# Altium footprint library 7-Connectors-13.PcbLib: 44 footprints (part 1 of 5)
Each footprint in its own frame and in the unit in brackets; x right, y up, seen from the top. Pads: shape width x height; smd on the part's side, far side on the other; paste and mask are expansions set on the pad; w line width, h text height; cw(c..) or ccw(c..) is an arc to the next point about the centre after c.
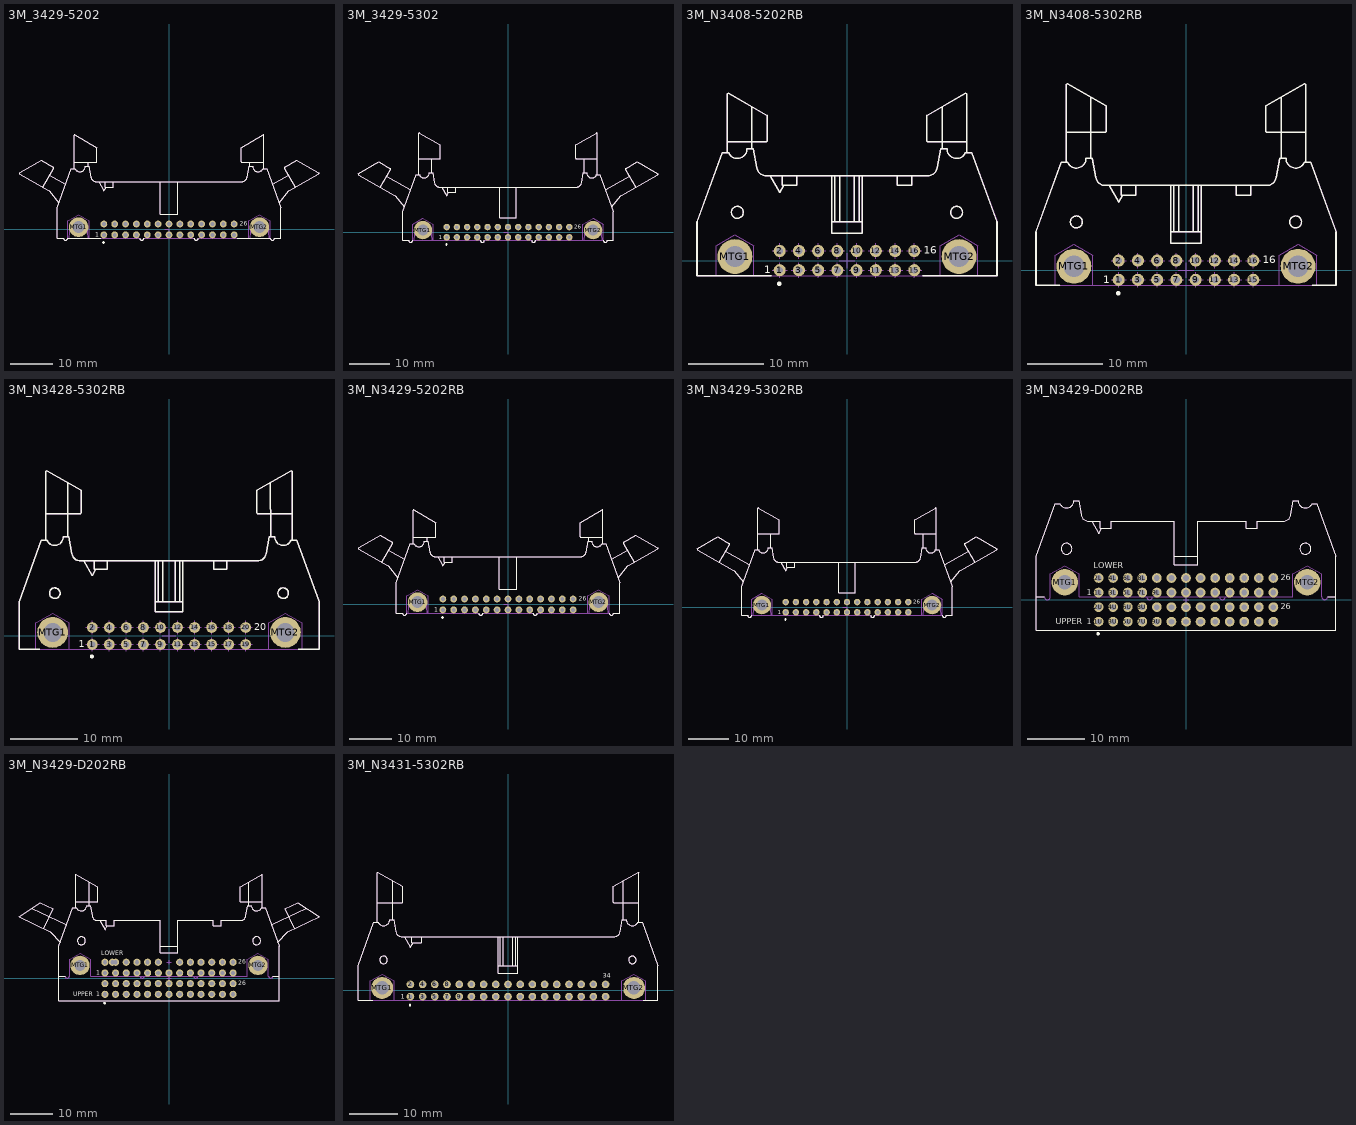
[diagram p0: the footprints below, top view; thin cyan lines are the x and y axes]

## 3M_3429-5202 [mm] "3M, 3000 Series, 26 Contacts - Pitch 2.54mm - Right Angle Four-Wall Header (Grey) With Short Roll Pin Latch/Ejectors"
height 8.6
pads (28):
  round 1.6 hole 0.9: 1(-15.24,-1.27) 2(-15.24,1.27) 3(-12.7,-1.27) 4(-12.7,1.27) 5(-10.16,-1.27) 6(-10.16,1.27) 7(-7.62,-1.27) 8(-7.62,1.27) 9(-5.08,-1.27) 10(-5.08,1.27) 11(-2.54,-1.27) 12(-2.54,1.27) 13(0,-1.27) 14(0,1.27) 15(2.54,-1.27) 16(2.54,1.27) 17(5.08,-1.27) 18(5.08,1.27) 19(7.62,-1.27) 20(7.62,1.27) 21(10.16,-1.27) 22(10.16,1.27) 23(12.7,-1.27) 24(12.7,1.27) 25(15.24,-1.27) 26(15.24,1.27)
  round 4.6 hole 2.8: MTG1(-21.146,0.533) MTG2(21.146,0.533)
Top Overlay:
  circle w0.3: c-15.313,-3.048 r0.15
  lines w0.2: -29.561,9.892 -26.983,14.358 ccw(c-27.071,14.409) -27.02,14.497 -29.935,16.179 -35.04,13.232 ccw(c-34.989,13.144) -35.04,13.056 -28.051,9.02 -25.74,6.266 ; -27.948,12.686 -24.192,10.517 ; -24.702,-2.009 -26.162,-2.007 -26.162,5.105 -22.834,14.249 -21.992,14.249 ccw(c-20.828,14.757) -19.558,14.756 -18.716,14.757 -18.274,12.251 ccw(c-17.023,12.471) -17.023,11.201 17.023,11.201 ccw(c17.023,12.471) 18.274,12.251 18.716,14.757 19.558,14.757 ccw(c20.828,14.757) 21.992,14.249 22.834,14.249 26.162,5.105 26.162,-2.007 24.702,-2.007 cw(c24.194,-2.007) 23.686,-2.007 16,-2.007 ; -24.702,-2.007 ccw(c-24.194,-2.007) -23.686,-2.007 -16,-2.007 ; -22.149,14.249 -22.149,22.024 cw(c-22.047,22.024) -21.996,22.112 -16.891,19.164 -16.891,15.799 cw(c-16.993,15.799) -16.993,15.697 -22.149,15.697 ; -18.923,14.757 -18.923,15.697 ; -16.478,11.201 -15.208,9.002 -14.671,9.931 ; -14.929,11.201 -14.929,9.931 -13.011,9.931 -13.011,11.201 ; -6.858,-2.007 ccw(c-6.35,-2.007) -5.842,-2.007 ; -2.032,11.201 -2.032,3.581 2.032,3.581 2.032,11.201 ; 5.842,-2.007 ccw(c6.35,-2.007) 6.858,-2.007 ; 18.923,14.757 18.923,15.697 ; 22.149,14.249 22.149,22.024 ccw(c22.047,22.024) 21.996,22.112 16.891,19.164 16.891,15.799 ccw(c16.993,15.799) 16.993,15.697 22.149,15.697 ; 24.192,10.517 27.948,12.686 ; 25.74,6.266 28.051,9.02 35.04,13.056 ccw(c34.989,13.144) 35.04,13.232 29.935,16.179 27.02,14.497 ccw(c27.071,14.409) 26.983,14.358 29.561,9.892
  text "26" at 16.5,0.889 h1.02
  text "1" at -17.272,-1.7 h1.02
Mechanical 8:
  circle w0.05: c15.24,1.27 r0.5
  circle w0.05: c12.7,1.27 r0.5
  circle w0.05: c10.16,1.27 r0.5
  circle w0.05: c7.62,1.27 r0.5
  circle w0.05: c5.08,1.27 r0.5
  circle w0.05: c2.54,1.27 r0.5
  circle w0.05: c0,1.27 r0.5
  circle w0.05: c-2.54,1.27 r0.5
  circle w0.05: c-5.08,1.27 r0.5
  circle w0.05: c-7.62,1.27 r0.5
  circle w0.05: c-10.16,1.27 r0.5
  circle w0.05: c-12.7,1.27 r0.5
  circle w0.05: c-15.24,1.27 r0.5
  circle w0.05: c-15.24,-1.27 r0.5
  circle w0.05: c-12.7,-1.27 r0.5
  circle w0.05: c-10.16,-1.27 r0.5
  circle w0.05: c-7.62,-1.27 r0.5
  circle w0.05: c-5.08,-1.27 r0.5
  circle w0.05: c-2.54,-1.27 r0.5
  circle w0.05: c0,-1.27 r0.5
  circle w0.05: c2.54,-1.27 r0.5
  circle w0.05: c5.08,-1.27 r0.5
  circle w0.05: c7.62,-1.27 r0.5
  circle w0.05: c10.16,-1.27 r0.5
  circle w0.05: c12.7,-1.27 r0.5
  circle w0.05: c15.24,-1.27 r0.5
  circle w0.1: c21.146,0.533 r1.3
  circle w0.05: c-21.146,0.533 r1.3
  lines w0.05: -1,0 0,0 0,-1
Mechanical 14:
  lines w0.1: -29.561,9.892 -26.983,14.358 ccw(c-27.071,14.409) -27.02,14.497 -29.935,16.179 -35.04,13.232 ccw(c-34.989,13.144) -35.04,13.056 -28.051,9.02 -25.74,6.266 ; -27.948,12.686 -24.192,10.517 ; -24.702,-2.009 -26.162,-2.007 -26.162,5.105 -22.834,14.249 -21.992,14.249 ccw(c-20.828,14.757) -19.558,14.756 -18.716,14.757 -18.274,12.251 ccw(c-17.023,12.471) -17.023,11.201 17.023,11.201 ccw(c17.023,12.471) 18.274,12.251 18.716,14.757 19.558,14.757 ccw(c20.828,14.757) 21.992,14.249 22.834,14.249 26.162,5.105 26.162,-2.007 24.702,-2.007 cw(c24.194,-2.007) 23.686,-2.007 6.858,-2.007 cw(c6.35,-2.007) 5.842,-2.007 -5.842,-2.007 cw(c-6.35,-2.007) -6.858,-2.007 -23.686,-2.007 cw(c-24.194,-2.007) -24.702,-2.007 ; -23.647,-2.007 -23.647,1.978 -21.146,3.422 -18.644,1.978 -18.644,-2.007 ; -23.28,-2.007 -23.043,0.699 cw(c-21.146,0.533) -19.248,0.699 -19.011,-2.007 ; -22.149,14.249 -22.149,22.024 cw(c-22.047,22.024) -21.996,22.112 -16.891,19.164 -16.891,15.799 cw(c-16.993,15.799) -16.993,15.697 -22.149,15.697 ; -18.923,14.757 -18.923,15.697 ; -16.478,11.201 -15.208,9.002 -14.671,9.931 ; -14.929,11.201 -14.929,9.931 -13.011,9.931 -13.011,11.201 ; -2.032,11.201 -2.032,3.581 2.032,3.581 2.032,11.201 ; 18.644,-2.007 18.644,1.978 21.146,3.422 23.647,1.978 23.647,-2.007 ; 18.923,14.757 18.923,15.697 ; 19.011,-2.007 19.248,0.699 cw(c21.146,0.533) 23.043,0.699 23.28,-2.007 ; 22.149,14.249 22.149,22.024 ccw(c22.047,22.024) 21.996,22.112 16.891,19.164 16.891,15.799 ccw(c16.993,15.799) 16.993,15.697 22.149,15.697 ; 24.192,10.517 27.948,12.686 ; 25.74,6.266 28.051,9.02 35.04,13.056 ccw(c34.989,13.144) 35.04,13.232 29.935,16.179 27.02,14.497 ccw(c27.071,14.409) 26.983,14.358 29.561,9.892
  text "26" at 16.5,0.889 h1.02
  text "1" at -17.272,-1.7 h1.02
3D body "3M_3429-5202.stp": height 8.64, standoff -3.94, extent -35.091,-2.513 35.091,16.181

## 3M_3429-5302 [mm] "3M, 3000 Series, 26 Contacts - Pitch 2.54mm - Right Angle Four-Wall Header (Grey) With Long Roll Pin Latch/Ejectors"
height 8.6
pads (28):
  round 1.6 hole 0.9: 1(-15.24,-1.27) 2(-15.24,1.27) 3(-12.7,-1.27) 4(-12.7,1.27) 5(-10.16,-1.27) 6(-10.16,1.27) 7(-7.62,-1.27) 8(-7.62,1.27) 9(-5.08,-1.27) 10(-5.08,1.27) 11(-2.54,-1.27) 12(-2.54,1.27) 13(0,-1.27) 14(0,1.27) 15(2.54,-1.27) 16(2.54,1.27) 17(5.08,-1.27) 18(5.08,1.27) 19(7.62,-1.27) 20(7.62,1.27) 21(10.16,-1.27) 22(10.16,1.27) 23(12.7,-1.27) 24(12.7,1.27) 25(15.24,-1.27) 26(15.24,1.27)
  round 4.6 hole 2.8: MTG1(-21.146,0.533) MTG2(21.146,0.533)
Top Overlay:
  circle w0.3: c-15.313,-3.048 r0.15
  lines w0.2: -31.759,11.161 -29.181,15.627 ccw(c-29.269,15.677) -29.218,15.765 -32.132,17.448 -37.238,14.5 ccw(c-37.187,14.412) -37.238,14.324 -28.051,9.02 -25.74,6.266 ; -30.146,13.955 -24.192,10.517 ; -23.686,-2.007 cw(c-24.194,-2.007) -24.702,-2.007 -26.162,-2.007 -26.162,5.105 -22.834,14.249 -21.992,14.249 ccw(c-20.828,14.757) -19.558,14.756 -18.716,14.757 -18.274,12.251 ccw(c-17.023,12.471) -17.023,11.201 17.023,11.201 ccw(c17.023,12.471) 18.274,12.251 18.716,14.757 19.558,14.757 ccw(c20.828,14.757) 21.992,14.249 22.834,14.249 26.162,5.105 26.162,-2.007 24.702,-2.007 cw(c24.194,-2.007) 23.686,-2.007 ; -22.149,14.249 -22.149,24.561 cw(c-22.047,24.561) -21.996,24.649 -16.891,21.702 -16.891,18.336 cw(c-16.993,18.336) -16.993,18.235 -22.149,18.235 ; -18.923,14.757 -18.923,18.235 ; -16.478,11.201 -15.208,9.002 -14.671,9.931 ; -14.929,11.201 -14.929,9.931 -13.011,9.931 -13.011,11.201 ; -6.858,-2.007 ccw(c-6.35,-2.007) -5.842,-2.007 ; -2.032,11.201 -2.032,3.581 2.032,3.581 2.032,11.201 ; 5.842,-2.007 ccw(c6.35,-2.007) 6.858,-2.007 ; 18.923,14.757 18.923,18.235 ; 22.149,14.249 22.149,24.561 ccw(c22.047,24.561) 21.996,24.649 16.891,21.702 16.891,18.336 ccw(c16.993,18.336) 16.993,18.235 22.149,18.235 ; 24.192,10.517 30.146,13.955 ; 25.74,6.266 28.051,9.02 37.238,14.324 ccw(c37.187,14.412) 37.238,14.5 32.132,17.448 29.218,15.765 ccw(c29.269,15.677) 29.181,15.627 31.759,11.161
  text "1" at -17.272,-1.7 h1.02
  text "26" at 16.5,0.889 h1.02
Mechanical 8:
  circle w0.05: c15.24,1.27 r0.5
  circle w0.05: c12.7,1.27 r0.5
  circle w0.05: c10.16,1.27 r0.5
  circle w0.05: c7.62,1.27 r0.5
  circle w0.05: c5.08,1.27 r0.5
  circle w0.05: c2.54,1.27 r0.5
  circle w0.05: c0,1.27 r0.5
  circle w0.05: c-2.54,1.27 r0.5
  circle w0.05: c-5.08,1.27 r0.5
  circle w0.05: c-7.62,1.27 r0.5
  circle w0.05: c-10.16,1.27 r0.5
  circle w0.05: c-12.7,1.27 r0.5
  circle w0.05: c-15.24,1.27 r0.5
  circle w0.05: c-15.24,-1.27 r0.5
  circle w0.05: c-12.7,-1.27 r0.5
  circle w0.05: c-10.16,-1.27 r0.5
  circle w0.05: c-7.62,-1.27 r0.5
  circle w0.05: c-5.08,-1.27 r0.5
  circle w0.05: c-2.54,-1.27 r0.5
  circle w0.05: c0,-1.27 r0.5
  circle w0.05: c2.54,-1.27 r0.5
  circle w0.05: c5.08,-1.27 r0.5
  circle w0.05: c7.62,-1.27 r0.5
  circle w0.05: c10.16,-1.27 r0.5
  circle w0.05: c12.7,-1.27 r0.5
  circle w0.05: c15.24,-1.27 r0.5
  circle w0.1: c21.146,0.533 r1.3
  circle w0.05: c-21.146,0.533 r1.3
  lines w0.05: 0,0 0,-1 0,0 ; 0,0 -1,0 0,0
Mechanical 14:
  lines w0.1: -31.759,11.161 -29.181,15.627 ccw(c-29.269,15.677) -29.218,15.765 -32.132,17.448 -37.238,14.5 ccw(c-37.187,14.412) -37.238,14.324 -28.051,9.02 -25.74,6.266 ; -30.146,13.955 -24.192,10.517 ; -23.647,-2.007 -23.647,1.978 -21.146,3.422 -18.644,1.978 -18.644,-2.007 ; -23.28,-2.007 -23.043,0.699 cw(c-21.146,0.533) -19.248,0.699 -19.011,-2.007 ; -22.149,14.249 -22.149,24.561 cw(c-22.047,24.561) -21.996,24.649 -16.891,21.702 -16.891,18.336 cw(c-16.993,18.336) -16.993,18.235 -22.149,18.235 ; -18.923,14.757 -18.923,18.235 ; -16.478,11.201 -15.208,9.002 -14.671,9.931 ; -14.929,11.201 -14.929,9.931 -13.011,9.931 -13.011,11.201 ; -2.032,11.201 -2.032,3.581 2.032,3.581 2.032,11.201 ; 18.644,-2.007 18.644,1.978 21.146,3.422 23.647,1.978 23.647,-2.007 ; 18.923,14.757 18.923,18.235 ; 19.011,-2.007 19.248,0.699 cw(c21.146,0.533) 23.043,0.699 23.28,-2.007 ; 22.149,14.249 22.149,24.561 ccw(c22.047,24.561) 21.996,24.649 16.891,21.702 16.891,18.336 ccw(c16.993,18.336) 16.993,18.235 22.149,18.235 ; 24.192,10.517 30.146,13.955 ; 25.74,6.266 28.051,9.02 37.238,14.324 ccw(c37.187,14.412) 37.238,14.5 32.132,17.448 29.218,15.765 ccw(c29.269,15.677) 29.181,15.627 31.759,11.161 ; -26.162,-2.007 -24.702,-2.007 ccw(c-24.194,-2.007) -23.686,-2.007 -6.858,-2.007 ccw(c-6.35,-2.007) -5.842,-2.007 5.842,-2.007 ccw(c6.35,-2.007) 6.858,-2.007 23.686,-2.007 ccw(c24.194,-2.007) 24.702,-2.007 26.162,-2.007 26.162,5.105 22.834,14.249 21.992,14.249 cw(c20.828,14.757) 19.558,14.757 18.716,14.757 18.274,12.251 cw(c17.023,12.471) 17.023,11.201 -17.023,11.201 cw(c-17.023,12.471) -18.274,12.251 -18.716,14.757 -19.558,14.756 cw(c-20.828,14.757) -21.992,14.249 -22.834,14.249 -26.162,5.105 -26.162,-2.007
  text "1" at -17.272,-1.7 h1.02
  text "26" at 16.5,0.889 h1.02
3D body "3M_3429-5302.stp": height 8.64, standoff -3.94, extent -37.288,-2.513 37.289,17.45

## 3M_N3408-5202RB [mm] "3M, 3000 Series, 16 Contacts - Pitch 2.54mm - Right Angle Four-Wall Header (Black) With Short Roll Pin Latch/Ejectors"
height 8.6
pads (18):
  round 1.6 hole 0.9: 1(-8.89,-1.27) 2(-8.89,1.27) 3(-6.35,-1.27) 4(-6.35,1.27) 5(-3.81,-1.27) 6(-3.81,1.27) 7(-1.27,-1.27) 8(-1.27,1.27) 9(1.27,-1.27) 10(1.27,1.27) 11(3.81,-1.27) 12(3.81,1.27) 13(6.35,-1.27) 14(6.35,1.27) 15(8.89,-1.27) 16(8.89,1.27)
  round 4.6 hole 2.8: MTG1(-14.796,0.533) MTG2(14.796,0.533)
Top Overlay:
  circle w0.3: c-8.963,-3.048 r0.15
  circle w0.2: c-14.478,6.375 r0.787
  circle w0.2: c14.478,6.375 r0.787
  lines w0.2: -15.799,14.249 -15.799,22.024 -15.646,22.112 -10.541,19.164 -10.541,15.799 -10.643,15.697 -15.799,15.697 ; -12.573,14.757 -12.573,20.337 ; -10.154,11.201 -8.884,9.002 -8.347,9.931 ; -10,-2.007 -19.812,-2.007 -19.812,5.105 -16.484,14.249 -15.642,14.249 ccw(c-14.478,14.757) -13.208,14.757 -12.366,14.757 -11.924,12.251 ccw(c-10.673,12.471) -10.673,11.201 10.673,11.201 ccw(c10.673,12.471) 11.924,12.251 12.366,14.757 13.208,14.757 ccw(c14.478,14.757) 15.642,14.249 16.484,14.249 19.812,5.105 19.812,-2.007 10,-2.007 ; -8.579,11.201 -8.579,9.931 -6.661,9.931 -6.668,11.201 ; -2.032,5.105 2.032,5.105 ; -2.032,11.201 -2.032,3.581 2.032,3.581 2.032,11.201 ; -1.587,5.105 -1.587,11.201 ; -0.953,5.105 -0.953,11.201 ; 0.953,5.105 0.953,11.201 ; 1.587,5.105 1.587,11.201 ; 6.668,11.201 6.661,9.931 8.579,9.931 8.573,11.201 ; 12.58,14.757 12.58,20.341 ; 15.799,14.249 15.799,22.024 15.646,22.112 10.541,19.164 10.541,15.799 10.643,15.697 15.799,15.697
  text "1" at -10.922,-1.7 h1.02
  text "16" at 10.15,0.889 h1.02
Mechanical 8:
  lines w0.1: -15.796,0.533 -14.796,0.533 ; -14.796,-0.467 -14.796,0.533 ; -14.796,1.533 -14.796,0.533 ; -13.796,0.533 -14.796,0.533 ; -9.89,-1.27 -8.89,-1.27 ; -9.89,1.27 -8.89,1.27 ; -8.89,-2.27 -8.89,-1.27 ; -8.89,-0.27 -8.89,-1.27 ; -8.89,0.27 -8.89,1.27 ; -8.89,2.27 -8.89,1.27 ; -7.89,-1.27 -8.89,-1.27 ; -7.89,1.27 -8.89,1.27 ; -7.35,-1.27 -6.35,-1.27 ; -7.35,1.27 -6.35,1.27 ; -6.35,-2.27 -6.35,-1.27 ; -6.35,-0.27 -6.35,-1.27 ; -6.35,0.27 -6.35,1.27 ; -6.35,2.27 -6.35,1.27 ; -5.35,-1.27 -6.35,-1.27 ; -5.35,1.27 -6.35,1.27 ; -4.81,-1.27 -3.81,-1.27 ; -4.81,1.27 -3.81,1.27 ; -3.81,-2.27 -3.81,-1.27 ; -3.81,-0.27 -3.81,-1.27 ; -3.81,0.27 -3.81,1.27 ; -3.81,2.27 -3.81,1.27 ; -2.81,-1.27 -3.81,-1.27 ; -2.81,1.27 -3.81,1.27 ; -2.27,-1.27 -1.27,-1.27 ; -2.27,1.27 -1.27,1.27 ; -1.27,-2.27 -1.27,-1.27 ; -1.27,-0.27 -1.27,-1.27 ; -1.27,0.27 -1.27,1.27 ; -1.27,2.27 -1.27,1.27 ; -1,0 0,0 ; -0.27,-1.27 -1.27,-1.27 ; -0.27,1.27 -1.27,1.27 ; 0,-1 0,0 ; 0,1 0,0 ; 0.27,-1.27 1.27,-1.27 ; 0.27,1.27 1.27,1.27 ; 1,0 0,0 ; 1.27,-2.27 1.27,-1.27 ; 1.27,-0.27 1.27,-1.27 ; 1.27,0.27 1.27,1.27 ; 1.27,2.27 1.27,1.27 ; 2.27,-1.27 1.27,-1.27 ; 2.27,1.27 1.27,1.27 ; 2.81,-1.27 3.81,-1.27 ; 2.81,1.27 3.81,1.27 ; 3.81,-2.27 3.81,-1.27 ; 3.81,-0.27 3.81,-1.27 ; 3.81,0.27 3.81,1.27 ; 3.81,2.27 3.81,1.27 ; 4.81,-1.27 3.81,-1.27 ; 4.81,1.27 3.81,1.27 ; 5.35,-1.27 6.35,-1.27 ; 5.35,1.27 6.35,1.27 ; 6.35,-2.27 6.35,-1.27 ; 6.35,-0.27 6.35,-1.27 ; 6.35,0.27 6.35,1.27 ; 6.35,2.27 6.35,1.27 ; 7.35,-1.27 6.35,-1.27 ; 7.35,1.27 6.35,1.27 ; 7.89,-1.27 8.89,-1.27 ; 7.89,1.27 8.89,1.27 ; 8.89,-2.27 8.89,-1.27 ; 8.89,-0.27 8.89,-1.27 ; 8.89,0.27 8.89,1.27 ; 8.89,2.27 8.89,1.27 ; 9.89,-1.27 8.89,-1.27 ; 9.89,1.27 8.89,1.27 ; 13.796,0.533 14.796,0.533 ; 14.796,-0.467 14.796,0.533 ; 14.796,1.533 14.796,0.533 ; 15.796,0.533 14.796,0.533
Mechanical 14:
  circle w0.1: c-14.478,6.375 r0.787
  circle w0.1: c14.478,6.375 r0.787
  circle w0.1: c14.796,0.533 r1.27
  circle w0.1: c-14.796,0.533 r1.27
  lines w0.1: -17.297,-2.007 -17.297,1.978 -14.796,3.422 -12.294,1.978 -12.294,-2.007 ; -15.799,14.249 -15.799,22.024 -15.646,22.112 -10.541,19.164 -10.541,15.799 -10.643,15.697 -15.799,15.697 ; -12.573,14.757 -12.573,20.337 ; -10.154,11.201 -8.884,9.002 -8.347,9.931 ; -8.579,11.201 -8.579,9.931 -6.661,9.931 -6.668,11.201 ; -2.032,5.105 2.032,5.105 ; -2.032,11.201 -2.032,3.581 2.032,3.581 2.032,11.201 ; -1.587,5.105 -1.587,11.201 ; -0.953,5.105 -0.953,11.201 ; 0.953,5.105 0.953,11.201 ; 1.587,5.105 1.587,11.201 ; 6.668,11.201 6.661,9.931 8.579,9.931 8.573,11.201 ; 12.294,-2.007 12.294,1.978 14.796,3.422 17.297,1.978 17.297,-2.007 ; 12.58,20.341 12.597,14.757 ; 15.799,14.249 15.799,22.024 15.646,22.112 10.541,19.164 10.541,15.799 10.643,15.697 15.799,15.697 ; -19.812,-2.007 -19.812,5.105 -16.484,14.249 -15.642,14.249 ccw(c-14.478,14.757) -13.208,14.757 -12.366,14.757 -11.924,12.251 ccw(c-10.673,12.471) -10.673,11.201 10.673,11.201 ccw(c10.673,12.471) 11.924,12.251 12.366,14.757 13.208,14.757 ccw(c14.478,14.757) 15.642,14.249 16.484,14.249 19.812,5.105 19.812,-2.007 -19.812,-2.007
  text "1" at -10.922,-1.7 h1.02
  text "16" at 10.15,0.889 h1.02
3D body "3M_3408-5202RB.stp": height 8.64, standoff -3.94, extent -19.812,-2.007 19.812,22.125

## 3M_N3408-5302RB [mm] "3M, 3000 Series, 16 Contacts - Pitch 2.54mm - Right Angle Four-Wall Header (Black) With Long Roll Pin Latch/Ejectors"
height 8.6
pads (18):
  round 1.6 hole 0.9: 1(-8.89,-1.27) 2(-8.89,1.27) 3(-6.35,-1.27) 4(-6.35,1.27) 5(-3.81,-1.27) 6(-3.81,1.27) 7(-1.27,-1.27) 8(-1.27,1.27) 9(1.27,-1.27) 10(1.27,1.27) 11(3.81,-1.27) 12(3.81,1.27) 13(6.35,-1.27) 14(6.35,1.27) 15(8.89,-1.27) 16(8.89,1.27)
  round 4.6 hole 2.8: MTG1(-14.796,0.533) MTG2(14.796,0.533)
Top Overlay:
  circle w0.2: c14.478,6.375 r0.787
  circle w0.2: c-14.478,6.375 r0.787
  circle w0.3: c-8.963,-3.048 r0.15
  lines w0.2: -16.7,-2.007 -19.812,-2.007 -19.812,5.105 -16.484,14.249 -15.642,14.249 ccw(c-14.478,14.757) -13.208,14.757 -12.366,14.757 -11.924,12.251 ccw(c-10.673,12.471) -10.673,11.201 10.673,11.201 ccw(c10.673,12.471) 11.924,12.251 12.366,14.757 13.208,14.757 ccw(c14.478,14.757) 15.642,14.249 16.484,14.249 19.812,5.105 19.812,-2.007 16.7,-2.007 ; -15.799,14.249 -15.799,24.561 -15.646,24.649 -10.541,21.702 -10.541,18.336 -10.643,18.235 -15.799,18.235 ; -12.573,14.757 -12.573,22.875 ; -10.154,11.201 -8.884,9.002 -8.347,9.931 ; -8.579,11.201 -8.579,9.931 -6.661,9.931 -6.668,11.201 ; -2.032,5.105 2.032,5.105 ; -2.032,11.201 -2.032,3.581 2.032,3.581 2.032,11.201 ; -1.587,5.105 -1.587,11.201 ; -0.953,5.105 -0.953,11.201 ; 0.953,5.105 0.953,11.201 ; 1.587,5.105 1.587,11.201 ; 6.668,11.201 6.661,9.931 8.579,9.931 8.573,11.201 ; 12.573,14.757 12.573,22.875 ; 15.799,14.249 15.799,24.561 15.646,24.649 10.541,21.702 10.541,18.336 10.643,18.235 15.799,18.235
  text "16" at 10.15,0.889 h1.02
  text "1" at -10.922,-1.7 h1.02
Mechanical 8:
  lines w0.1: -15.796,0.533 -14.796,0.533 ; -14.796,-0.467 -14.796,0.533 ; -14.796,1.533 -14.796,0.533 ; -13.796,0.533 -14.796,0.533 ; -9.89,-1.27 -8.89,-1.27 ; -9.89,1.27 -8.89,1.27 ; -8.89,-2.27 -8.89,-1.27 ; -8.89,-0.27 -8.89,-1.27 ; -8.89,0.27 -8.89,1.27 ; -8.89,2.27 -8.89,1.27 ; -7.89,-1.27 -8.89,-1.27 ; -7.89,1.27 -8.89,1.27 ; -7.35,-1.27 -6.35,-1.27 ; -7.35,1.27 -6.35,1.27 ; -6.35,-2.27 -6.35,-1.27 ; -6.35,-0.27 -6.35,-1.27 ; -6.35,0.27 -6.35,1.27 ; -6.35,2.27 -6.35,1.27 ; -5.35,-1.27 -6.35,-1.27 ; -5.35,1.27 -6.35,1.27 ; -4.81,-1.27 -3.81,-1.27 ; -4.81,1.27 -3.81,1.27 ; -3.81,-2.27 -3.81,-1.27 ; -3.81,-0.27 -3.81,-1.27 ; -3.81,0.27 -3.81,1.27 ; -3.81,2.27 -3.81,1.27 ; -2.81,-1.27 -3.81,-1.27 ; -2.81,1.27 -3.81,1.27 ; -2.27,-1.27 -1.27,-1.27 ; -2.27,1.27 -1.27,1.27 ; -1.27,-2.27 -1.27,-1.27 ; -1.27,-0.27 -1.27,-1.27 ; -1.27,0.27 -1.27,1.27 ; -1.27,2.27 -1.27,1.27 ; -1,0 0,0 ; -0.27,-1.27 -1.27,-1.27 ; -0.27,1.27 -1.27,1.27 ; 0,-1 0,0 ; 0,1 0,0 ; 0.27,-1.27 1.27,-1.27 ; 0.27,1.27 1.27,1.27 ; 1,0 0,0 ; 1.27,-2.27 1.27,-1.27 ; 1.27,-0.27 1.27,-1.27 ; 1.27,0.27 1.27,1.27 ; 1.27,2.27 1.27,1.27 ; 2.27,-1.27 1.27,-1.27 ; 2.27,1.27 1.27,1.27 ; 2.81,-1.27 3.81,-1.27 ; 2.81,1.27 3.81,1.27 ; 3.81,-2.27 3.81,-1.27 ; 3.81,-0.27 3.81,-1.27 ; 3.81,0.27 3.81,1.27 ; 3.81,2.27 3.81,1.27 ; 4.81,-1.27 3.81,-1.27 ; 4.81,1.27 3.81,1.27 ; 5.35,-1.27 6.35,-1.27 ; 5.35,1.27 6.35,1.27 ; 6.35,-2.27 6.35,-1.27 ; 6.35,-0.27 6.35,-1.27 ; 6.35,0.27 6.35,1.27 ; 6.35,2.27 6.35,1.27 ; 7.35,-1.27 6.35,-1.27 ; 7.35,1.27 6.35,1.27 ; 7.89,-1.27 8.89,-1.27 ; 7.89,1.27 8.89,1.27 ; 8.89,-2.27 8.89,-1.27 ; 8.89,-0.27 8.89,-1.27 ; 8.89,0.27 8.89,1.27 ; 8.89,2.27 8.89,1.27 ; 9.89,-1.27 8.89,-1.27 ; 9.89,1.27 8.89,1.27 ; 13.796,0.533 14.796,0.533 ; 14.796,-0.467 14.796,0.533 ; 14.796,1.533 14.796,0.533 ; 15.796,0.533 14.796,0.533
Mechanical 14:
  circle w0.1: c-14.796,0.533 r1.27
  circle w0.1: c14.796,0.533 r1.27
  circle w0.1: c14.478,6.375 r0.787
  circle w0.1: c-14.478,6.375 r0.787
  lines w0.1: -17.297,-2.007 -17.297,1.978 -14.796,3.422 -12.294,1.978 -12.294,-2.007 ; -15.799,14.249 -15.799,24.561 -15.646,24.649 -10.541,21.702 -10.541,18.336 -10.643,18.235 -15.799,18.235 ; -12.573,14.757 -12.573,22.875 ; -10.154,11.201 -8.884,9.002 -8.347,9.931 ; -8.579,11.201 -8.579,9.931 -6.661,9.931 -6.668,11.201 ; -2.032,5.105 2.032,5.105 ; -2.032,11.201 -2.032,3.581 2.032,3.581 2.032,11.201 ; -1.587,5.105 -1.587,11.201 ; -0.953,5.105 -0.953,11.201 ; 0.953,5.105 0.953,11.201 ; 1.587,5.105 1.587,11.201 ; 6.668,11.201 6.661,9.931 8.579,9.931 8.573,11.201 ; 12.294,-2.007 12.294,1.978 14.796,3.422 17.297,1.978 17.297,-2.007 ; 12.573,22.875 12.597,14.757 ; 15.799,14.249 15.799,24.561 15.646,24.649 10.541,21.702 10.541,18.336 10.643,18.235 15.799,18.235 ; -19.812,-2.007 19.812,-2.007 19.812,5.105 16.484,14.249 15.642,14.249 cw(c14.478,14.757) 13.208,14.757 12.366,14.757 11.924,12.251 cw(c10.673,12.471) 10.673,11.201 -10.673,11.201 cw(c-10.673,12.471) -11.924,12.251 -12.366,14.757 -13.208,14.757 cw(c-14.478,14.757) -15.642,14.249 -16.484,14.249 -19.812,5.105 -19.812,-2.007
  text "16" at 10.15,0.889 h1.02
  text "1" at -10.922,-1.7 h1.02
3D body "3M_3408-5302RB.stp": height 8.64, standoff -3.94, extent -19.812,-2.007 19.812,24.663

## 3M_N3428-5302RB [mm] "3M, 3000 Series, 20 Contacts - Pitch 2.54mm - Right Angle Four-Wall Header (Black) With Long Roll Pin Latch/Ejectors"
height 8.6
pads (22):
  round 1.6 hole 0.9: 1(-11.43,-1.27) 2(-11.43,1.27) 3(-8.89,-1.27) 4(-8.89,1.27) 5(-6.35,-1.27) 6(-6.35,1.27) 7(-3.81,-1.27) 8(-3.81,1.27) 9(-1.27,-1.27) 10(-1.27,1.27) 11(1.27,-1.27) 12(1.27,1.27) 13(3.81,-1.27) 14(3.81,1.27) 15(6.35,-1.27) 16(6.35,1.27) 17(8.89,-1.27) 18(8.89,1.27) 19(11.43,-1.27) 20(11.43,1.27)
  round 4.6 hole 2.8: MTG1(-17.336,0.533) MTG2(17.336,0.533)
Top Overlay:
  circle w0.3: c-11.503,-3.048 r0.15
  circle w0.2: c-17.018,6.375 r0.787
  circle w0.2: c17.018,6.375 r0.787
  lines w0.2: -19.24,-2.007 -22.352,-2.007 -22.352,5.105 -19.024,14.249 -18.182,14.249 ccw(c-17.018,14.757) -15.748,14.757 -14.906,14.757 -14.464,12.251 ccw(c-13.213,12.471) -13.213,11.201 13.213,11.201 ccw(c13.213,12.471) 14.464,12.251 14.906,14.757 15.748,14.757 ccw(c17.018,14.757) 18.182,14.249 19.024,14.249 22.352,5.105 22.352,-2.007 19.24,-2.007 ; -18.339,14.249 -18.339,24.561 -18.186,24.649 -13.081,21.702 -13.081,18.336 -13.183,18.235 -18.339,18.235 ; -15.113,14.757 -15.113,22.875 ; -12.694,11.201 -11.424,9.002 -10.887,9.931 ; -11.119,11.201 -11.119,9.931 -9.201,9.931 -9.208,11.201 ; -2.032,5.105 2.032,5.105 ; -2.032,11.201 -2.032,3.581 2.032,3.581 2.032,11.201 ; -1.587,5.105 -1.587,11.201 ; -0.953,5.105 -0.953,11.201 ; 0.953,5.105 0.953,11.201 ; 1.587,5.105 1.587,11.201 ; 6.668,11.201 6.661,9.931 8.579,9.931 8.573,11.201 ; 15.113,22.875 15.137,14.757 ; 18.339,14.249 18.339,24.561 18.186,24.649 13.081,21.702 13.081,18.336 13.183,18.235 18.339,18.235
  text "1" at -13.462,-1.7 h1.02
  text "20" at 12.69,0.889 h1.02
Mechanical 8:
  lines w0.1: -18.336,0.533 -17.336,0.533 ; -17.336,-0.467 -17.336,0.533 ; -17.336,1.533 -17.336,0.533 ; -16.336,0.533 -17.336,0.533 ; -12.43,-1.27 -11.43,-1.27 ; -12.43,1.27 -11.43,1.27 ; -11.43,-2.27 -11.43,-1.27 ; -11.43,-0.27 -11.43,-1.27 ; -11.43,0.27 -11.43,1.27 ; -11.43,2.27 -11.43,1.27 ; -10.43,-1.27 -11.43,-1.27 ; -10.43,1.27 -11.43,1.27 ; -9.89,-1.27 -8.89,-1.27 ; -9.89,1.27 -8.89,1.27 ; -8.89,-2.27 -8.89,-1.27 ; -8.89,-0.27 -8.89,-1.27 ; -8.89,0.27 -8.89,1.27 ; -8.89,2.27 -8.89,1.27 ; -7.89,-1.27 -8.89,-1.27 ; -7.89,1.27 -8.89,1.27 ; -7.35,-1.27 -6.35,-1.27 ; -7.35,1.27 -6.35,1.27 ; -6.35,-2.27 -6.35,-1.27 ; -6.35,-0.27 -6.35,-1.27 ; -6.35,0.27 -6.35,1.27 ; -6.35,2.27 -6.35,1.27 ; -5.35,-1.27 -6.35,-1.27 ; -5.35,1.27 -6.35,1.27 ; -4.81,-1.27 -3.81,-1.27 ; -4.81,1.27 -3.81,1.27 ; -3.81,-2.27 -3.81,-1.27 ; -3.81,-0.27 -3.81,-1.27 ; -3.81,0.27 -3.81,1.27 ; -3.81,2.27 -3.81,1.27 ; -2.81,-1.27 -3.81,-1.27 ; -2.81,1.27 -3.81,1.27 ; -2.27,-1.27 -1.27,-1.27 ; -2.27,1.27 -1.27,1.27 ; -1.27,-2.27 -1.27,-1.27 ; -1.27,-0.27 -1.27,-1.27 ; -1.27,0.27 -1.27,1.27 ; -1.27,2.27 -1.27,1.27 ; -1,0 0,0 ; -0.27,-1.27 -1.27,-1.27 ; -0.27,1.27 -1.27,1.27 ; 0,-1 0,0 ; 0,1 0,0 ; 0.27,-1.27 1.27,-1.27 ; 0.27,1.27 1.27,1.27 ; 1,0 0,0 ; 1.27,-2.27 1.27,-1.27 ; 1.27,-0.27 1.27,-1.27 ; 1.27,0.27 1.27,1.27 ; 1.27,2.27 1.27,1.27 ; 2.27,-1.27 1.27,-1.27 ; 2.27,1.27 1.27,1.27 ; 2.81,-1.27 3.81,-1.27 ; 2.81,1.27 3.81,1.27 ; 3.81,-2.27 3.81,-1.27 ; 3.81,-0.27 3.81,-1.27 ; 3.81,0.27 3.81,1.27 ; 3.81,2.27 3.81,1.27 ; 4.81,-1.27 3.81,-1.27 ; 4.81,1.27 3.81,1.27 ; 5.35,-1.27 6.35,-1.27 ; 5.35,1.27 6.35,1.27 ; 6.35,-2.27 6.35,-1.27 ; 6.35,-0.27 6.35,-1.27 ; 6.35,0.27 6.35,1.27 ; 6.35,2.27 6.35,1.27 ; 7.35,-1.27 6.35,-1.27 ; 7.35,1.27 6.35,1.27 ; 7.89,-1.27 8.89,-1.27 ; 7.89,1.27 8.89,1.27 ; 8.89,-2.27 8.89,-1.27 ; 8.89,-0.27 8.89,-1.27 ; 8.89,0.27 8.89,1.27 ; 8.89,2.27 8.89,1.27 ; 9.89,-1.27 8.89,-1.27 ; 9.89,1.27 8.89,1.27 ; 10.43,-1.27 11.43,-1.27 ; 10.43,1.27 11.43,1.27 ; 11.43,-2.27 11.43,-1.27 ; 11.43,-0.27 11.43,-1.27 ; 11.43,0.27 11.43,1.27 ; 11.43,2.27 11.43,1.27 ; 12.43,-1.27 11.43,-1.27 ; 12.43,1.27 11.43,1.27 ; 16.336,0.533 17.336,0.533 ; 17.336,-0.467 17.336,0.533 ; 17.336,1.533 17.336,0.533 ; 18.336,0.533 17.336,0.533